# Altium footprint library Vowstar_Connector.PcbLib: 127 footprints (part 7 of 8)
Each footprint in its own frame and in the unit in brackets; x right, y up, seen from the top. Pads: shape width x height; smd on the part's side, far side on the other; paste and mask are expansions set on the pad; w line width, h text height; cw(c..) or ccw(c..) is an arc to the next point about the centre after c.
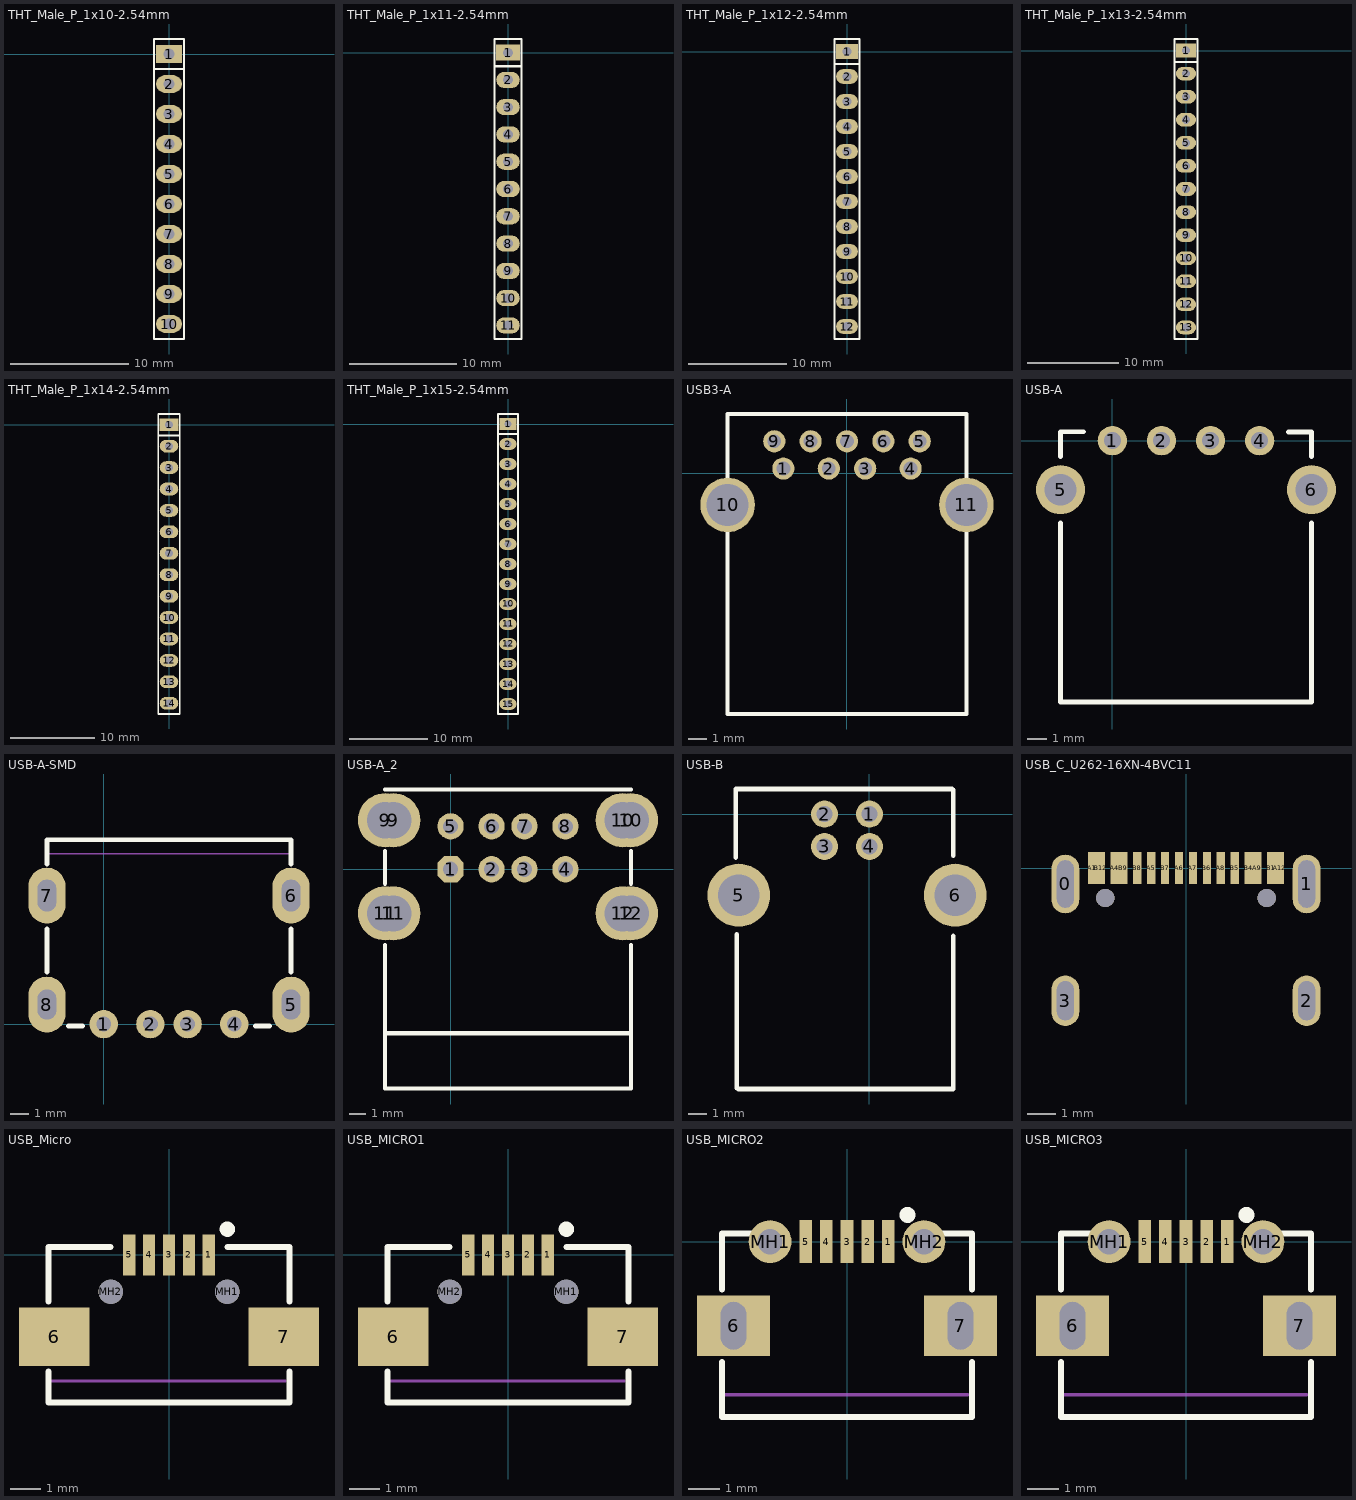
[diagram p6: the footprints below, top view; thin cyan lines are the x and y axes]

## THT_Male_P_1x10-2.54mm [mm] "THT Male pin header strip 1x10 2.54mm pitch"
height 11.43
pads (10):
  rect 2.2x1.5 hole 0.9: 1(0,0)
  oval 2.2x1.5 hole 0.9: 2(0,-2.54) 3(0,-5.08) 4(0,-7.62) 5(0,-10.16) 6(0,-12.7) 7(0,-15.24) 8(0,-17.78) 9(0,-20.32) 10(0,-22.86)
Top Overlay:
  lines w0.2: -1.27,-1.27 1.27,-1.27 ; -1.27,-24.13 -1.27,1.27 1.27,1.27 1.27,-24.13 -1.27,-24.13
3D body "User Library-Male-Pin Header Strip-1x1-2.54mm.step": height 8.51, standoff -3.68, extent -1.46,-19.05 1.46,-16.51
3D body "User Library-Male-Pin Header Strip-1x1-2.54mm.step": height 8.51, standoff -3.68, extent -1.46,-21.59 1.46,-19.05
3D body "User Library-Male-Pin Header Strip-1x1-2.54mm.step": height 8.51, standoff -3.68, extent -1.46,-24.13 1.46,-21.59
3D body "User Library-Male-Pin Header Strip-1x1-2.54mm.step": height 8.51, standoff -3.68, extent -1.46,-16.51 1.46,-13.97
3D body "User Library-Male-Pin Header Strip-1x1-2.54mm.step": height 8.51, standoff -3.68, extent -1.46,-13.97 1.46,-11.43
3D body "User Library-Male-Pin Header Strip-1x1-2.54mm.step": height 8.51, standoff -3.68, extent -1.46,-6.35 1.46,-3.81
3D body "User Library-Male-Pin Header Strip-1x1-2.54mm.step": height 8.51, standoff -3.68, extent -1.46,-8.89 1.46,-6.35
3D body "User Library-Male-Pin Header Strip-1x1-2.54mm.step": height 8.51, standoff -3.68, extent -1.46,-11.43 1.46,-8.89
3D body "User Library-Male-Pin Header Strip-1x1-2.54mm.step": height 8.51, standoff -3.68, extent -1.46,-3.81 1.46,-1.27
3D body "User Library-Male-Pin Header Strip-1x1-2.54mm.step": height 8.51, standoff -3.68, extent -1.46,-1.27 1.46,1.27

## THT_Male_P_1x11-2.54mm [mm] "THT Male pin header strip 1x11 2.54mm pitch"
height 11.43
pads (11):
  rect 2.2x1.5 hole 0.9: 1(0,0)
  oval 2.2x1.5 hole 0.9: 2(0,-2.54) 3(0,-5.08) 4(0,-7.62) 5(0,-10.16) 6(0,-12.7) 7(0,-15.24) 8(0,-17.78) 9(0,-20.32) 10(0,-22.86) 11(0,-25.4)
Top Overlay:
  lines w0.2: -1.27,-1.27 1.27,-1.27 ; -1.27,-26.67 1.27,-26.67 1.27,1.27 -1.27,1.27 -1.27,-26.67
3D body "User Library-Male-Pin Header Strip-1x1-2.54mm.step": height 8.51, standoff -3.68, extent -1.46,-26.67 1.46,-24.13
3D body "User Library-Male-Pin Header Strip-1x1-2.54mm.step": height 8.51, standoff -3.68, extent -1.46,-19.05 1.46,-16.51
3D body "User Library-Male-Pin Header Strip-1x1-2.54mm.step": height 8.51, standoff -3.68, extent -1.46,-21.59 1.46,-19.05
3D body "User Library-Male-Pin Header Strip-1x1-2.54mm.step": height 8.51, standoff -3.68, extent -1.46,-24.13 1.46,-21.59
3D body "User Library-Male-Pin Header Strip-1x1-2.54mm.step": height 8.51, standoff -3.68, extent -1.46,-16.51 1.46,-13.97
3D body "User Library-Male-Pin Header Strip-1x1-2.54mm.step": height 8.51, standoff -3.68, extent -1.46,-13.97 1.46,-11.43
3D body "User Library-Male-Pin Header Strip-1x1-2.54mm.step": height 8.51, standoff -3.68, extent -1.46,-6.35 1.46,-3.81
3D body "User Library-Male-Pin Header Strip-1x1-2.54mm.step": height 8.51, standoff -3.68, extent -1.46,-8.89 1.46,-6.35
3D body "User Library-Male-Pin Header Strip-1x1-2.54mm.step": height 8.51, standoff -3.68, extent -1.46,-11.43 1.46,-8.89
3D body "User Library-Male-Pin Header Strip-1x1-2.54mm.step": height 8.51, standoff -3.68, extent -1.46,-3.81 1.46,-1.27
3D body "User Library-Male-Pin Header Strip-1x1-2.54mm.step": height 8.51, standoff -3.68, extent -1.46,-1.27 1.46,1.27

## THT_Male_P_1x12-2.54mm [mm] "THT Male pin header strip 1x12 2.54mm pitch"
height 11.43
pads (12):
  rect 2.2x1.5 hole 0.9: 1(0,0)
  oval 2.2x1.5 hole 0.9: 2(0,-2.54) 3(0,-5.08) 4(0,-7.62) 5(0,-10.16) 6(0,-12.7) 7(0,-15.24) 8(0,-17.78) 9(0,-20.32) 10(0,-22.86) 11(0,-25.4) 12(0,-27.94)
Top Overlay:
  lines w0.2: -1.27,-1.27 1.27,-1.27 ; -1.27,-29.21 1.27,-29.21 1.27,1.27 -1.27,1.27 -1.27,-29.21
3D body "User Library-Male-Pin Header Strip-1x1-2.54mm.step": height 8.51, standoff -3.68, extent -1.46,-13.97 1.46,-11.43
3D body "User Library-Male-Pin Header Strip-1x1-2.54mm.step": height 8.51, standoff -3.68, extent -1.46,-6.35 1.46,-3.81
3D body "User Library-Male-Pin Header Strip-1x1-2.54mm.step": height 8.51, standoff -3.68, extent -1.46,-8.89 1.46,-6.35
3D body "User Library-Male-Pin Header Strip-1x1-2.54mm.step": height 8.51, standoff -3.68, extent -1.46,-11.43 1.46,-8.89
3D body "User Library-Male-Pin Header Strip-1x1-2.54mm.step": height 8.51, standoff -3.68, extent -1.46,-3.81 1.46,-1.27
3D body "User Library-Male-Pin Header Strip-1x1-2.54mm.step": height 8.51, standoff -3.68, extent -1.46,-1.27 1.46,1.27
3D body "User Library-Male-Pin Header Strip-1x1-2.54mm.step": height 8.51, standoff -3.68, extent -1.46,-29.21 1.46,-26.67
3D body "User Library-Male-Pin Header Strip-1x1-2.54mm.step": height 8.51, standoff -3.68, extent -1.46,-21.59 1.46,-19.05
3D body "User Library-Male-Pin Header Strip-1x1-2.54mm.step": height 8.51, standoff -3.68, extent -1.46,-24.13 1.46,-21.59
3D body "User Library-Male-Pin Header Strip-1x1-2.54mm.step": height 8.51, standoff -3.68, extent -1.46,-26.67 1.46,-24.13
3D body "User Library-Male-Pin Header Strip-1x1-2.54mm.step": height 8.51, standoff -3.68, extent -1.46,-19.05 1.46,-16.51
3D body "User Library-Male-Pin Header Strip-1x1-2.54mm.step": height 8.51, standoff -3.68, extent -1.46,-16.51 1.46,-13.97

## THT_Male_P_1x13-2.54mm [mm] "THT Male pin header strip 1x13 2.54mm pitch"
height 11.43
pads (13):
  rect 2.2x1.5 hole 0.9: 1(0,0)
  oval 2.2x1.5 hole 0.9: 2(0,-2.54) 3(0,-5.08) 4(0,-7.62) 5(0,-10.16) 6(0,-12.7) 7(0,-15.24) 8(0,-17.78) 9(0,-20.32) 10(0,-22.86) 11(0,-25.4) 12(0,-27.94) 13(0,-30.48)
Top Overlay:
  lines w0.2: -1.27,-1.27 1.27,-1.27 ; -1.27,-31.75 1.27,-31.75 1.27,1.27 -1.27,1.27 -1.27,-31.75
3D body "User Library-Male-Pin Header Strip-1x1-2.54mm.step": height 8.51, standoff -3.68, extent -1.46,-31.75 1.46,-29.21
3D body "User Library-Male-Pin Header Strip-1x1-2.54mm.step": height 8.51, standoff -3.68, extent -1.46,-16.51 1.46,-13.97
3D body "User Library-Male-Pin Header Strip-1x1-2.54mm.step": height 8.51, standoff -3.68, extent -1.46,-19.05 1.46,-16.51
3D body "User Library-Male-Pin Header Strip-1x1-2.54mm.step": height 8.51, standoff -3.68, extent -1.46,-26.67 1.46,-24.13
3D body "User Library-Male-Pin Header Strip-1x1-2.54mm.step": height 8.51, standoff -3.68, extent -1.46,-24.13 1.46,-21.59
3D body "User Library-Male-Pin Header Strip-1x1-2.54mm.step": height 8.51, standoff -3.68, extent -1.46,-21.59 1.46,-19.05
3D body "User Library-Male-Pin Header Strip-1x1-2.54mm.step": height 8.51, standoff -3.68, extent -1.46,-29.21 1.46,-26.67
3D body "User Library-Male-Pin Header Strip-1x1-2.54mm.step": height 8.51, standoff -3.68, extent -1.46,-1.27 1.46,1.27
3D body "User Library-Male-Pin Header Strip-1x1-2.54mm.step": height 8.51, standoff -3.68, extent -1.46,-3.81 1.46,-1.27
3D body "User Library-Male-Pin Header Strip-1x1-2.54mm.step": height 8.51, standoff -3.68, extent -1.46,-11.43 1.46,-8.89
3D body "User Library-Male-Pin Header Strip-1x1-2.54mm.step": height 8.51, standoff -3.68, extent -1.46,-8.89 1.46,-6.35
3D body "User Library-Male-Pin Header Strip-1x1-2.54mm.step": height 8.51, standoff -3.68, extent -1.46,-6.35 1.46,-3.81
3D body "User Library-Male-Pin Header Strip-1x1-2.54mm.step": height 8.51, standoff -3.68, extent -1.46,-13.97 1.46,-11.43

## THT_Male_P_1x14-2.54mm [mm] "THT Male pin header strip 1x14 2.54mm pitch"
height 11.43
pads (14):
  rect 2.2x1.5 hole 0.9: 1(0,0)
  oval 2.2x1.5 hole 0.9: 2(0,-2.54) 3(0,-5.08) 4(0,-7.62) 5(0,-10.16) 6(0,-12.7) 7(0,-15.24) 8(0,-17.78) 9(0,-20.32) 10(0,-22.86) 11(0,-25.4) 12(0,-27.94) 13(0,-30.48) 14(0,-33.02)
Top Overlay:
  lines w0.2: -1.27,-1.27 1.27,-1.27 ; -1.27,-34.29 -1.27,1.27 1.27,1.27 1.27,-34.29 -1.27,-34.29
3D body "User Library-Male-Pin Header Strip-1x1-2.54mm.step": height 8.51, standoff -3.68, extent -1.46,-19.05 1.46,-16.51
3D body "User Library-Male-Pin Header Strip-1x1-2.54mm.step": height 8.51, standoff -3.68, extent -1.46,-21.59 1.46,-19.05
3D body "User Library-Male-Pin Header Strip-1x1-2.54mm.step": height 8.51, standoff -3.68, extent -1.46,-24.13 1.46,-21.59
3D body "User Library-Male-Pin Header Strip-1x1-2.54mm.step": height 8.51, standoff -3.68, extent -1.46,-16.51 1.46,-13.97
3D body "User Library-Male-Pin Header Strip-1x1-2.54mm.step": height 8.51, standoff -3.68, extent -1.46,-13.97 1.46,-11.43
3D body "User Library-Male-Pin Header Strip-1x1-2.54mm.step": height 8.51, standoff -3.68, extent -1.46,-6.35 1.46,-3.81
3D body "User Library-Male-Pin Header Strip-1x1-2.54mm.step": height 8.51, standoff -3.68, extent -1.46,-8.89 1.46,-6.35
3D body "User Library-Male-Pin Header Strip-1x1-2.54mm.step": height 8.51, standoff -3.68, extent -1.46,-11.43 1.46,-8.89
3D body "User Library-Male-Pin Header Strip-1x1-2.54mm.step": height 8.51, standoff -3.68, extent -1.46,-3.81 1.46,-1.27
3D body "User Library-Male-Pin Header Strip-1x1-2.54mm.step": height 8.51, standoff -3.68, extent -1.46,-1.27 1.46,1.27
3D body "User Library-Male-Pin Header Strip-1x1-2.54mm.step": height 8.51, standoff -3.68, extent -1.46,-26.67 1.46,-24.13
3D body "User Library-Male-Pin Header Strip-1x1-2.54mm.step": height 8.51, standoff -3.68, extent -1.46,-34.29 1.46,-31.75
3D body "User Library-Male-Pin Header Strip-1x1-2.54mm.step": height 8.51, standoff -3.68, extent -1.46,-31.75 1.46,-29.21
3D body "User Library-Male-Pin Header Strip-1x1-2.54mm.step": height 8.51, standoff -3.68, extent -1.46,-29.21 1.46,-26.67

## THT_Male_P_1x15-2.54mm [mm] "THT Male pin header strip 1x15 2.54mm pitch"
height 11.43
pads (15):
  rect 2.2x1.5 hole 0.9: 1(0,0)
  oval 2.2x1.5 hole 0.9: 2(0,-2.54) 3(0,-5.08) 4(0,-7.62) 5(0,-10.16) 6(0,-12.7) 7(0,-15.24) 8(0,-17.78) 9(0,-20.32) 10(0,-22.86) 11(0,-25.4) 12(0,-27.94) 13(0,-30.48) 14(0,-33.02) 15(0,-35.56)
Top Overlay:
  lines w0.2: -1.27,-1.27 1.27,-1.27 ; -1.27,-36.83 1.27,-36.83 1.27,1.27 -1.27,1.27 -1.27,-36.83
3D body "User Library-Male-Pin Header Strip-1x1-2.54mm.step": height 8.51, standoff -3.68, extent -1.46,-36.83 1.46,-34.29
3D body "User Library-Male-Pin Header Strip-1x1-2.54mm.step": height 8.51, standoff -3.68, extent -1.46,-29.21 1.46,-26.67
3D body "User Library-Male-Pin Header Strip-1x1-2.54mm.step": height 8.51, standoff -3.68, extent -1.46,-31.75 1.46,-29.21
3D body "User Library-Male-Pin Header Strip-1x1-2.54mm.step": height 8.51, standoff -3.68, extent -1.46,-34.29 1.46,-31.75
3D body "User Library-Male-Pin Header Strip-1x1-2.54mm.step": height 8.51, standoff -3.68, extent -1.46,-26.67 1.46,-24.13
3D body "User Library-Male-Pin Header Strip-1x1-2.54mm.step": height 8.51, standoff -3.68, extent -1.46,-1.27 1.46,1.27
3D body "User Library-Male-Pin Header Strip-1x1-2.54mm.step": height 8.51, standoff -3.68, extent -1.46,-3.81 1.46,-1.27
3D body "User Library-Male-Pin Header Strip-1x1-2.54mm.step": height 8.51, standoff -3.68, extent -1.46,-11.43 1.46,-8.89
3D body "User Library-Male-Pin Header Strip-1x1-2.54mm.step": height 8.51, standoff -3.68, extent -1.46,-8.89 1.46,-6.35
3D body "User Library-Male-Pin Header Strip-1x1-2.54mm.step": height 8.51, standoff -3.68, extent -1.46,-6.35 1.46,-3.81
3D body "User Library-Male-Pin Header Strip-1x1-2.54mm.step": height 8.51, standoff -3.68, extent -1.46,-13.97 1.46,-11.43
3D body "User Library-Male-Pin Header Strip-1x1-2.54mm.step": height 8.51, standoff -3.68, extent -1.46,-16.51 1.46,-13.97
3D body "User Library-Male-Pin Header Strip-1x1-2.54mm.step": height 8.51, standoff -3.68, extent -1.46,-24.13 1.46,-21.59
3D body "User Library-Male-Pin Header Strip-1x1-2.54mm.step": height 8.51, standoff -3.68, extent -1.46,-21.59 1.46,-19.05
3D body "User Library-Male-Pin Header Strip-1x1-2.54mm.step": height 8.51, standoff -3.68, extent -1.46,-19.05 1.46,-16.51

## USB3-A [mm] "USB3.0 Connector"
pads (11):
  round 1.219 hole 0.762: 1(-3.5,0.25) 2(-1,0.25) 3(1,0.25) 4(3.5,0.25) 5(4,1.75) 6(2,1.75) 7(0,1.75) 8(-2,1.75) 9(-4,1.75)
  round 3 hole 2.3: 10(-6.57,-1.75) 11(6.57,-1.75)
Top Overlay:
  lines w0.203: -6.57,-13.25 -6.57,-8.25 -6.57,3.25 6.57,3.25 6.57,-13.25 -6.57,-13.25

## USB-A [mil]
pads (6):
  round 60 hole 35: 1(0,0) 2(100,0) 3(200,0) 4(300,0)
  round 100 hole 65: 5(-105.91,-100) 6(405.91,-100)
Top Overlay:
  lines w10: -105.91,-168.09 -105.91,-533.07 405.91,-533.07 405.91,-168.09 ; -105.91,-32.09 -105.91,18.11 -59.11,18.11 ; 359,18 405.8,18 ; 405.8,-32.2 405.8,18 ; 405.91,18.11 405.8,18
3D body "User Library-USB-A-female.step": height 273.62, standoff -165.35, extent -161.02,-509.37 461.02,30

## USB-A-SMD [mm]
pads (8):
  round 1.524 hole 0.8: 1(0,0) 2(2.5,0) 3(4.5,0) 4(7,0)
  oval 2x3 hole 1 slot 1.6 at 90 deg: 5(10.05,1.05) 8(-3.05,1.05)
  oval 2x3 hole 1 slot 1.7 at 90 deg: 6(10.05,6.9) 7(-3.05,6.9)
Top Overlay:
  lines w0.254: -3.05,2.794 -3.05,5.1 ; -3.05,8.6 -3.05,9.9 9.95,9.9 ; -1.905,-0.1 -1.143,-0.1 ; 8.128,-0.1 8.89,-0.1 ; 10.05,2.794 10.05,5.1 ; 10.05,8.6 10.05,9.9
Mechanical 13:
  lines w0.1: -3.048,9.144 10.033,9.144
  text "PCB Edge" at 9.271,9.525 h0.25
3D body: height 0, standoff -2.25, extent 9.906,0.254 10.16,1.778
3D body: height 0, standoff -2.25, extent -3.175,0.254 -2.921,1.778
3D body: height 0, standoff -2.25, extent 9.906,6.096 10.16,7.747
3D body: height 0, standoff -2.25, extent -3.175,6.096 -2.921,7.747
3D body: height 3.1, standoff 3, extent 6.35,0.762 7.62,7.62
3D body: height 3.1, standoff 3, extent 3.81,0.762 5.08,7.62
3D body: height 3.1, standoff 3, extent 1.905,0.762 3.175,7.62
3D body: height 3.1, standoff 3, extent -0.635,0.762 0.635,7.62
3D body: height 6.7, standoff 6.5, extent -3.048,-0.127 10.033,8.255
3D body: height 6.7, standoff 0, extent 9.906,-0.127 10.541,9.906
3D body: height 0.2, standoff 0, extent -3.556,-0.127 10.541,9.906
3D body: height 2.25, standoff -2.25, extent -0.381,-0.127 0.381,0.127
3D body: height 2.25, standoff -2.25, extent 2.159,-0.127 2.921,0.127
3D body: height 2.25, standoff -2.25, extent 4.064,-0.127 4.826,0.127
3D body: height 2.25, standoff -2.25, extent 6.604,-0.127 7.366,0.127
3D body: height 6.7, standoff 0, extent -3.048,-0.127 10.033,0.381
3D body: height 6.7, standoff 0, extent -3.556,-0.127 -2.921,9.906
3D body: height 6.7, standoff 6.5, extent -3.556,3.175 10.541,9.906
3D body: height 3, standoff 1, extent -1.905,0.635 8.89,9.525

## USB-A_2 [mm]
pads (16):
  oct 1.6x1.6 hole 0.92: 1(0,0)
  round 1.6 hole 0.92: 2(2.5,0) 3(4.5,0) 4(7,0) 5(0,2.62) 6(2.5,2.62) 7(4.5,2.62) 8(7,2.62)
  round 3.3 hole 2.2: 9(-4,2.99) 9(-3.5,2.99) 10(10.5,2.99) 10(11,2.99) 11(-4,-2.69) 11(-3.5,-2.69) 12(10.5,-2.69) 12(11,-2.69)
Top Overlay:
  lines w0.254: -4,-10 11,-10 ; -4,-4.63 -4,-13.38 11,-13.38 11,-4.63 ; -4,-0.88 -4,1.12 ; -4,4.87 11,4.87 ; 11,-0.88 11,1.12

## USB-B [mm]
pads (6):
  round 1.5 hole 0.9: 1(0,0) 2(-2.5,0) 3(-2.5,-1.8) 4(0,-1.8)
  round 3.5 hole 2.3: 5(-7.27,-4.51) 6(4.77,-4.51)
Top Overlay:
  lines w0.254: -7.442,-2.413 -7.442,1.397 ; -7.391,-15.24 -7.391,-6.68 ; -7.391,1.397 4.597,1.397 ; -7.29,-15.291 4.648,-15.291 4.648,-6.782 ; 4.648,-2.311 4.648,1.346

## USB_C_U262-16XN-4BVC11 [mm] "U262-16XN-4BVC11 USB TYPE-C FEMALE"
height 1.2
pads (20):
  oval 1x2.1 hole 0.6 slot 1.7 at 90 deg: 0(-4.32,-0.57) 1(4.32,-0.57)
  oval 1x1.8 hole 0.6 slot 1.4 at 90 deg: 2(4.32,-4.75) 3(-4.32,-4.75)
  rect 0.3x1.14 smd: A1(-3.35,0) A4(-2.55,0) A5(-1.25,0) A6(-0.25,0) A7(0.25,0) A8(1.25,0) A9(2.55,0) A12(3.35,0) B1(3.05,0) B4(2.25,0) B5(1.75,0) B6(0.75,0) B7(-0.75,0) B8(-1.75,0) B9(-2.25,0) B12(-3.05,0)
via -2.89,-1.07 diameter 0.65 hole 0.65
via 2.89,-1.07 diameter 0.65 hole 0.65
3D body "uj31-ch-g2-smt-tr.stp": height 4.2, standoff -1.46, extent -4.856,-9.2 4.856,0.8

## USB_Micro [mm]
pads (9):
  rect 0.4x1.35 smd: 1(1.3,0) 2(0.65,0) 3(0,0) 4(-0.65,0) 5(-1.3,0)
  rect 2.3x1.9 smd: 6(-3.75,-2.675) 7(3.75,-2.675)
  round 0.8 hole 0.8 unplated: MH1(1.9,-1.208) MH2(-1.9,-1.208)
Top Overlay:
  circle w0.25: c1.905,0.84 r0.125
  lines w0.2: -3.937,-3.81 -3.937,-4.825 3.937,-4.825 3.937,-3.81 ; -3.937,-1.524 -3.937,0.254 -1.905,0.254 ; 1.905,0.254 3.937,0.254 3.937,-1.524
Mechanical 13:
  lines w0.1: -3.937,-4.125 3.81,-4.125
3D body "Micro_USB.STEP": height 2.77, standoff -0.17, extent -3.99,-5.193 3.99,0.237

## USB_MICRO1 [mm]
pads (9):
  rect 0.4x1.35 smd: 1(1.3,0) 2(0.65,0) 3(0,0) 4(-0.65,0) 5(-1.3,0)
  rect 2.3x1.9 smd: 6(-3.75,-2.675) 7(3.75,-2.675)
  round 0.8 hole 0.8 unplated: MH1(1.9,-1.208) MH2(-1.9,-1.208)
Top Overlay:
  circle w0.25: c1.905,0.84 r0.125
  lines w0.2: -3.937,-3.81 -3.937,-4.825 3.937,-4.825 3.937,-3.81 ; -3.937,-1.524 -3.937,0.254 -1.905,0.254 ; 1.905,0.254 3.937,0.254 3.937,-1.524
Mechanical 13:
  lines w0.1: -3.937,-4.125 3.81,-4.125
3D body "Micro_USB_1.STEP": height 2.79, standoff -0.28, extent -4.4,-5.416 4.4,0.209

## USB_MICRO2 [mm]
pads (9):
  rect 0.4x1.35 smd: 1(1.3,0) 2(0.65,0) 3(0,0) 4(-0.65,0) 5(-1.3,0)
  rect 2.3x1.9 hole 0.8 slot 1.5 at 90 deg: 6(-3.575,-2.65) 7(3.575,-2.65)
  round 1.35 hole 0.8 unplated: MH1(-2.425,0) MH2(2.425,0)
Top Overlay:
  circle w0.25: c1.905,0.84 r0.125
  lines w0.2: -3.937,-3.8 -3.937,-5.525 3.937,-5.525 3.937,-3.8 ; -3.937,-1.5 -3.937,0.254 -1.905,0.254 ; 1.905,0.254 3.937,0.254 3.937,-1.5
Mechanical 13:
  lines w0.1: -3.937,-4.825 3.81,-4.825
3D body "Micro_USB_2.STEP": height 2.88, standoff -0.43, extent -4.1,-5.28 4.1,0.15

## USB_MICRO3 [mm]
pads (9):
  rect 0.4x1.35 smd: 1(1.3,0) 2(0.65,0) 3(0,0) 4(-0.65,0) 5(-1.3,0)
  rect 2.3x1.9 hole 0.8 slot 1.5 at 90 deg: 6(-3.575,-2.65) 7(3.575,-2.65)
  round 1.35 hole 0.8 unplated: MH1(-2.425,0) MH2(2.425,0)
Top Overlay:
  circle w0.25: c1.905,0.84 r0.125
  lines w0.2: -3.937,-3.8 -3.937,-5.525 3.937,-5.525 3.937,-3.8 ; -3.937,-1.5 -3.937,0.254 -1.905,0.254 ; 1.905,0.254 3.937,0.254 3.937,-1.5
Mechanical 13:
  lines w0.1: -3.937,-4.825 3.81,-4.825
3D body "Micro_USB_3.STEP": height 2.79, standoff -0.87, extent -4.06,-5.316 4.061,0.309